# Altium footprint library SMT.PcbLib: 151 footprints (part 4 of 10)
Each footprint in its own frame and in the unit in brackets; x right, y up, seen from the top. Pads: shape width x height; smd on the part's side, far side on the other; paste and mask are expansions set on the pad; w line width, h text height; cw(c..) or ccw(c..) is an arc to the next point about the centre after c.
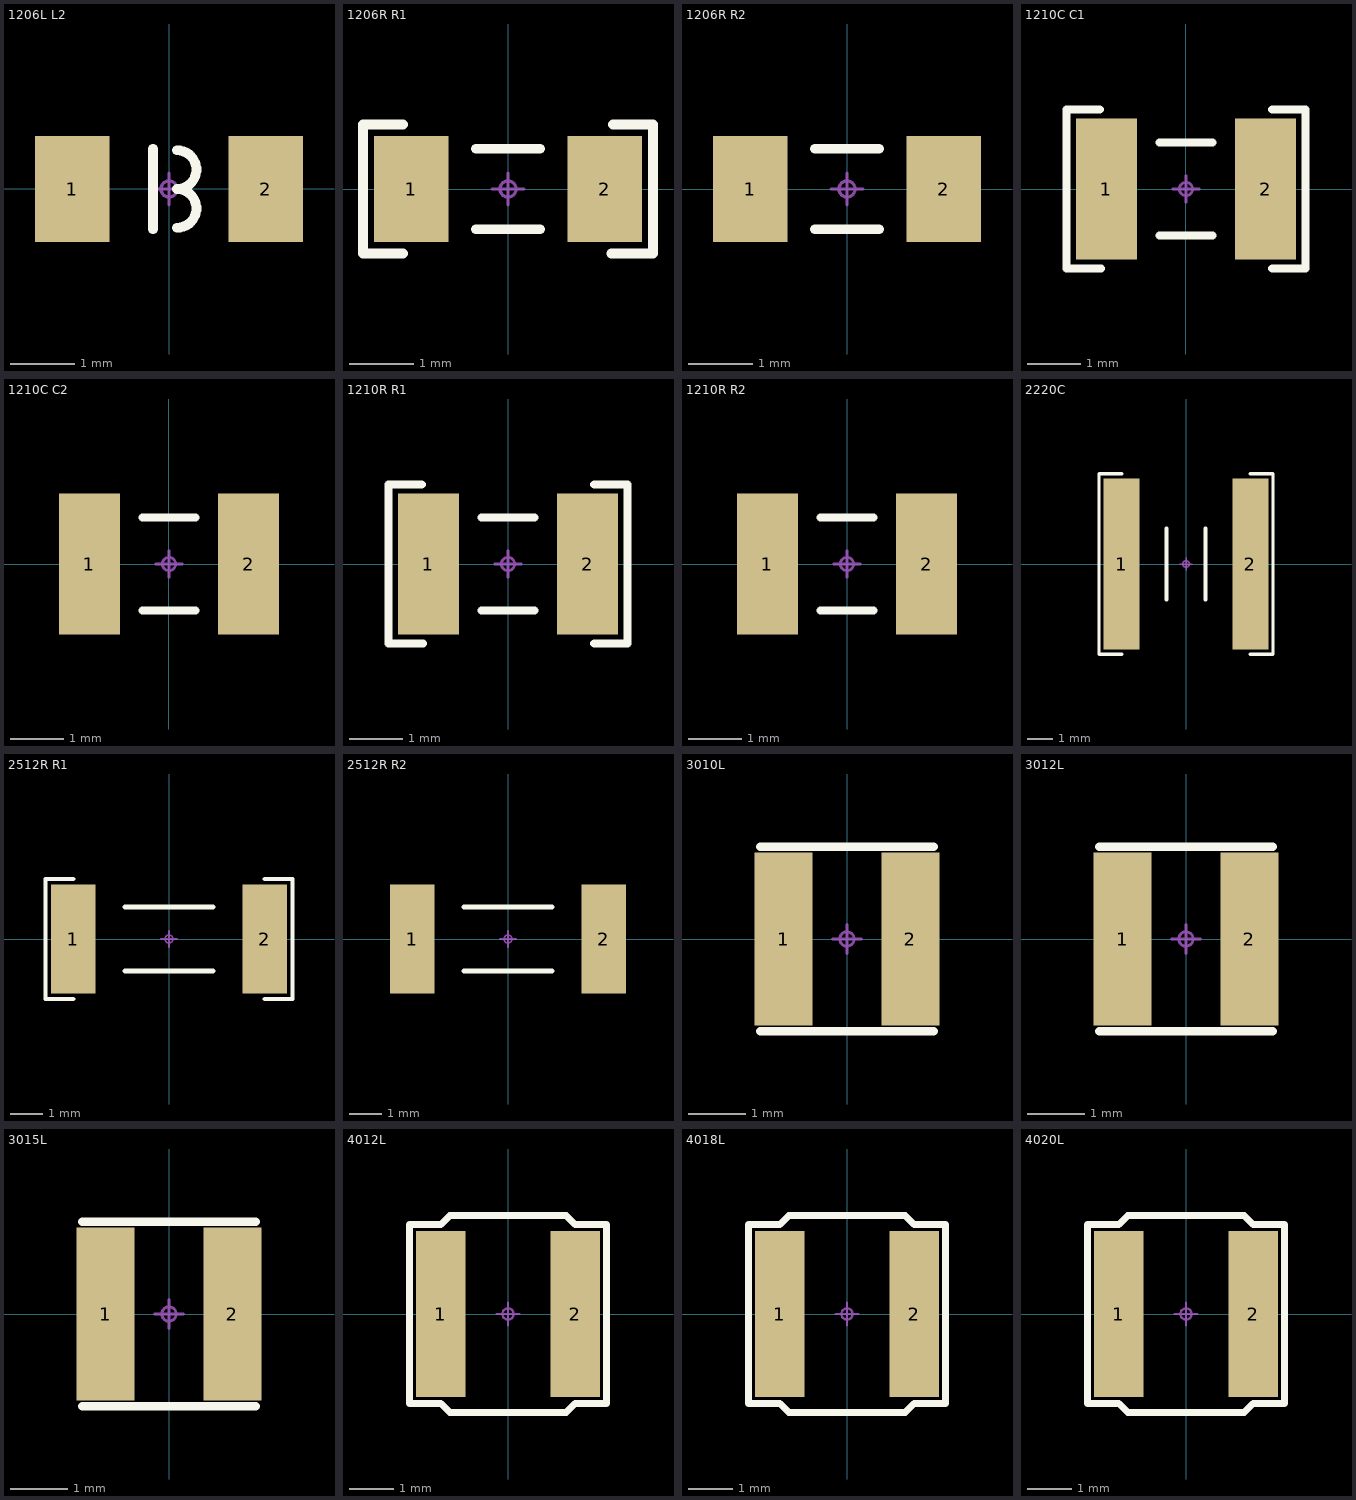
[diagram p3: the footprints below, top view; thin cyan lines are the x and y axes]

## 1206L L2 [mm]
pads (2):
  rect 1.15x1.65 smd paste-0.05: 1(-1.5,0) 2(1.5,0)
Top Overlay:
  lines w0.152: -0.25,-0.625 -0.25,0.625 ; 0.125,-0.6 ccw(c0.125,-0.3) 0.125,0 ccw(c0.125,0.3) 0.125,0.6
Mechanical 15:
  circle w0.05: c0,0 r0.125
  lines w0.05: -0.25,0 0.25,0 ; 0,-0.25 0,0.25
3D body "R1206.STEP": height 0.6, standoff 0, extent -1.6,-0.8 1.6,0.8

## 1206R R1 [mm]
pads (2):
  rect 1.15x1.65 smd paste-0.05: 1(-1.5,0) 2(1.5,0)
Top Overlay:
  lines w0.152: -1.625,-1 -2.25,-1 -2.25,1 -1.625,1 ; -0.5,-0.625 0.5,-0.625 ; -0.5,0.625 0.5,0.625 ; 1.6,-1 2.25,-1 2.25,1 1.625,1
Mechanical 15:
  circle w0.05: c0,0 r0.125
  lines w0.05: -0.25,0 0.25,0 ; 0,-0.25 0,0.25
3D body "R1206.STEP": height 0.6, standoff 0, extent -1.6,-0.8 1.6,0.8

## 1206R R2 [mm]
pads (2):
  rect 1.15x1.65 smd paste-0.05: 1(-1.5,0) 2(1.5,0)
Top Overlay:
  lines w0.152: -0.5,-0.625 0.5,-0.625 ; -0.5,0.625 0.5,0.625
Mechanical 15:
  circle w0.05: c0,0 r0.125
  lines w0.05: -0.25,0 0.25,0 ; 0,-0.25 0,0.25
3D body "R1206.STEP": height 0.6, standoff 0, extent -1.6,-0.8 1.6,0.8

## 1210C C1 [mm]
pads (2):
  rect 1.15x2.65 smd paste-0.05: 1(-1.5,0) 2(1.5,0)
Top Overlay:
  lines w0.152: -1.625,1.5 -2.25,1.5 -2.25,-1.5 -1.6,-1.5 ; -0.5,-0.875 0.5,-0.875 ; -0.5,0.875 0.5,0.875 ; 1.625,-1.5 2.25,-1.5 2.25,1.5 1.625,1.5
Mechanical 15:
  circle w0.05: c0,0 r0.125
  lines w0.05: -0.25,0 0.25,0 ; 0,-0.25 0,0.25
3D body "1210-c.stp": height 2.5, standoff 0, extent -1.6,-1.25 1.6,1.25

## 1210C C2 [mm]
pads (2):
  rect 1.15x2.65 smd paste-0.05: 1(-1.5,0) 2(1.5,0)
Top Overlay:
  lines w0.152: -0.5,-0.875 0.5,-0.875 ; -0.5,0.875 0.5,0.875
Mechanical 15:
  circle w0.05: c0,0 r0.125
  lines w0.05: -0.25,0 0.25,0 ; 0,-0.25 0,0.25
3D body "1210-c.stp": height 2.5, standoff 0, extent -1.6,-1.25 1.6,1.25

## 1210R R1 [mm]
pads (2):
  rect 1.15x2.65 smd paste-0.05: 1(-1.5,0) 2(1.5,0)
Top Overlay:
  lines w0.152: -1.625,1.5 -2.25,1.5 -2.25,-1.5 -1.6,-1.5 ; -0.5,-0.875 0.5,-0.875 ; -0.5,0.875 0.5,0.875 ; 1.625,-1.5 2.25,-1.5 2.25,1.5 1.625,1.5
Mechanical 15:
  circle w0.05: c0,0 r0.125
  lines w0.05: -0.25,0 0.25,0 ; 0,-0.25 0,0.25
3D body "1210-r.stp": height 0.56, standoff 0, extent -1.6,-1.25 1.6,1.25

## 1210R R2 [mm]
pads (2):
  rect 1.15x2.65 smd paste-0.05: 1(-1.5,0) 2(1.5,0)
Top Overlay:
  lines w0.152: -0.5,-0.875 0.5,-0.875 ; -0.5,0.875 0.5,0.875
Mechanical 15:
  circle w0.05: c0,0 r0.125
  lines w0.05: -0.25,0 0.25,0 ; 0,-0.25 0,0.25
3D body "1210-r.stp": height 0.56, standoff 0, extent -1.6,-1.25 1.6,1.25

## 2220C [mm]
height 1.4
pads (2):
  rect 1.4x6.65 smd: 1(-2.5,0) 2(2.5,0)
Top Overlay:
  lines w0.127: -2.5,-3.5 -3.375,-3.5 -3.375,3.5 -2.5,3.5 ; 2.5,-3.5 3.375,-3.5 3.375,3.5 2.5,3.5
  lines w0.152: -0.75,-1.375 -0.75,1.375 ; 0.75,-1.375 0.75,1.375
Mechanical 15:
  circle w0.05: c0,0 r0.125
  lines w0.05: -0.25,0 0.25,0 ; 0,-0.25 0,0.25
3D body "User Library-SMD CAPACITOR.STEP": height 1, standoff 0, extent -2.8,-3.15 2.8,3.15

## 2512R R1 [mm]
height 0.9
pads (2):
  rect 1.4x3.4 smd paste-0.1: 1(-3,0) 2(3,0)
Top Overlay:
  lines w0.127: -3,-1.875 -3.875,-1.875 -3.875,1.875 -3,1.875 ; 3,-1.875 3.875,-1.875 3.875,1.875 3,1.875
  lines w0.152: -1.375,-1 1.375,-1 ; -1.375,1 1.375,1
Mechanical 15:
  circle w0.05: c0,0 r0.125
  lines w0.05: -0.25,0 0.25,0 ; 0,-0.25 0,0.25
3D body "RESC6432X06.step": height 0.6, standoff 0, extent -3.2,-1.6 3.2,1.6

## 2512R R2 [mm]
height 0.9
pads (2):
  rect 1.4x3.4 smd paste-0.1: 1(-3,0) 2(3,0)
Top Overlay:
  lines w0.152: -1.375,-1 1.375,-1 ; -1.375,1 1.375,1
Mechanical 15:
  circle w0.05: c0,0 r0.125
  lines w0.05: -0.25,0 0.25,0 ; 0,-0.25 0,0.25
3D body "RESC6432X06.step": height 0.6, standoff 0, extent -3.2,-1.6 3.2,1.6

## 3010L [mm]
height 3.1
pads (2):
  rect 1x3 smd mask+0.051: 1(-1.1,0) 2(1.1,0)
Top Overlay:
  lines w0.152: -1.5,-1.6 1.5,-1.6 ; -1.5,1.6 1.5,1.6
Mechanical 15:
  circle w0.05: c0,0 r0.125
  lines w0.05: -0.25,0 0.25,0 ; 0,-0.25 0,0.25
3D body "swpa3012S.stp": height 1.2, standoff -0.02, extent -1.5,-1.5 1.5,1.5

## 3012L [mm]
height 3.1
pads (2):
  rect 1x3 smd mask+0.051: 1(-1.1,0) 2(1.1,0)
Top Overlay:
  lines w0.152: -1.5,-1.6 1.5,-1.6 ; -1.5,1.6 1.5,1.6
Mechanical 15:
  circle w0.05: c0,0 r0.125
  lines w0.05: -0.25,0 0.25,0 ; 0,-0.25 0,0.25
3D body "swpa3012S.stp": height 1.2, standoff -0.02, extent -1.5,-1.5 1.5,1.5

## 3015L [mm]
height 3.1
pads (2):
  rect 1x3 smd mask+0.051: 1(-1.1,0) 2(1.1,0)
Top Overlay:
  lines w0.152: -1.5,-1.6 1.5,-1.6 ; -1.5,1.6 1.5,1.6
Mechanical 15:
  circle w0.05: c0,0 r0.125
  lines w0.05: -0.25,0 0.25,0 ; 0,-0.25 0,0.25
3D body "swpa3012S.stp": height 1.2, standoff -0.02, extent -1.5,-1.5 1.5,1.5

## 4012L [mm]
height 3.1
pads (2):
  rect 1.1x3.7 smd mask+0.051: 1(-1.5,0) 2(1.5,0)
Top Overlay:
  lines w0.152: -2.2,-2 -1.5,-2 -1.3,-2.2 1.3,-2.2 1.5,-2 2.2,-2 2.2,2 1.5,2 1.3,2.2 -1.3,2.2 -1.5,2 -2.2,2 -2.2,-2
Mechanical 15:
  circle w0.05: c0,0 r0.125
  lines w0.05: -0.25,0 0.25,0 ; 0,-0.25 0,0.25
3D body "swpa4012s.stp": height 1.2, standoff -0.02, extent -2,-2 2,2

## 4018L [mm]
height 3.1
pads (2):
  rect 1.1x3.7 smd mask+0.051: 1(-1.5,0) 2(1.5,0)
Top Overlay:
  lines w0.152: -2.2,-2 -1.5,-2 -1.3,-2.2 1.3,-2.2 1.5,-2 2.2,-2 2.2,2 1.5,2 1.3,2.2 -1.3,2.2 -1.5,2 -2.2,2 -2.2,-2
Mechanical 15:
  circle w0.05: c0,0 r0.125
  lines w0.05: -0.25,0 0.25,0 ; 0,-0.25 0,0.25
3D body "swpa4018s.stp": height 1.8, standoff -0.02, extent -2,-2 2,2

## 4020L [mm]
height 3.1
pads (2):
  rect 1.1x3.7 smd mask+0.051: 1(-1.5,0) 2(1.5,0)
Top Overlay:
  lines w0.152: -2.2,-2 -2.2,2 -1.5,2 -1.3,2.2 1.3,2.2 1.5,2 2.2,2 2.2,-2 1.5,-2 1.3,-2.2 -1.3,-2.2 -1.5,-2 -2.2,-2
Mechanical 15:
  circle w0.05: c0,0 r0.125
  lines w0.05: -0.25,0 0.25,0 ; 0,-0.25 0,0.25
3D body "swpa4020s.stp": height 2, standoff -0.02, extent -2,-2 2,2